# Altium schematic symbol library con-molex.SCHLIB: 368 symbols (part 1 of 6) (continued)
## 53?-05048 (continued)
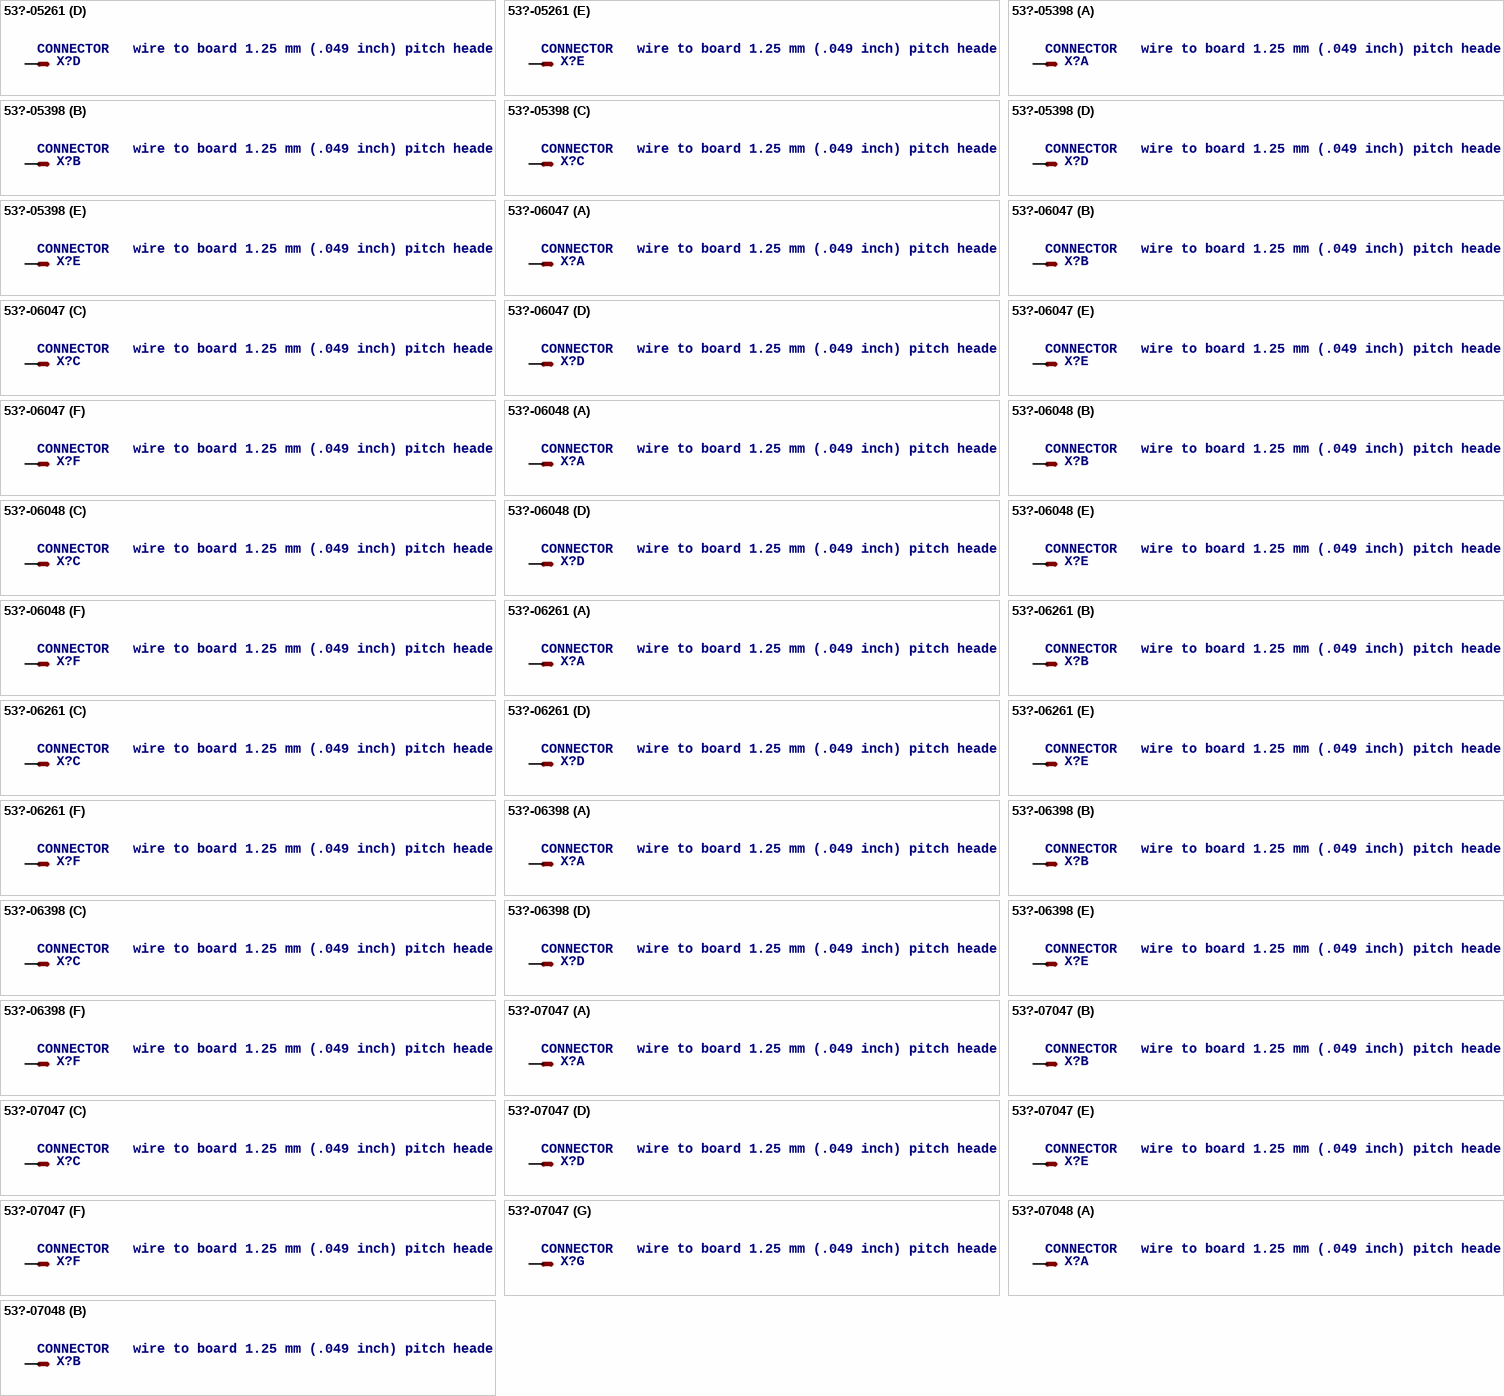
[diagram p7: symbols 53?-05261 to 53?-07048]

## 53?-05261
designator X?, comment CONNECTOR   wire to board 1.25 mm (.049 inch) pitch header
OC_FARNELL: 1433644; OC_NEWARK: unknown
footprint 53261-05
part A pins: 1 S
part B pins: 2 S
part C pins: 3 S
part D pins: 4 S
part E pins: 5 S

## 53?-05398
designator X?, comment CONNECTOR   wire to board 1.25 mm (.049 inch) pitch header
OC_FARNELL: 1125354; OC_NEWARK: unknown
footprint 53398-05
part A pins: 1 S
part B pins: 2 S
part C pins: 3 S
part D pins: 4 S
part E pins: 5 S

## 53?-06047
designator X?, comment CONNECTOR   wire to board 1.25 mm (.049 inch) pitch header
MPN: 53047-0610-C; OC_FARNELL: 9733078; OC_NEWARK: 03M2965
footprint 53047-06
part A pins: 1 S
part B pins: 2 S
part C pins: 3 S
part D pins: 4 S
part E pins: 5 S
part F pins: 6 S

## 53?-06048
designator X?, comment CONNECTOR   wire to board 1.25 mm (.049 inch) pitch header
MPN: 53048-0610; MF: WALDOM/MOLEX; OC_FARNELL: 1012260; OC_NEWARK: 38C9911
footprint 53048-06
part A pins: 1 S
part B pins: 2 S
part C pins: 3 S
part D pins: 4 S
part E pins: 5 S
part F pins: 6 S

## 53?-06261
designator X?, comment CONNECTOR   wire to board 1.25 mm (.049 inch) pitch header
OC_FARNELL: 1125375; OC_NEWARK: unknown
footprint 53261-06
part A pins: 1 S
part B pins: 2 S
part C pins: 3 S
part D pins: 4 S
part E pins: 5 S
part F pins: 6 S

## 53?-06398
designator X?, comment CONNECTOR   wire to board 1.25 mm (.049 inch) pitch header
OC_FARNELL: 1125368; OC_NEWARK: unknown
footprint 53398-06
part A pins: 1 S
part B pins: 2 S
part C pins: 3 S
part D pins: 4 S
part E pins: 5 S
part F pins: 6 S

## 53?-07047
designator X?, comment CONNECTOR   wire to board 1.25 mm (.049 inch) pitch header
MPN: 53047-0710-C; OC_FARNELL: 9732870; OC_NEWARK: 11M0149
footprint 53047-07
part A pins: 1 S
part B pins: 2 S
part C pins: 3 S
part D pins: 4 S
part E pins: 5 S
part F pins: 6 S
part G pins: 7 S

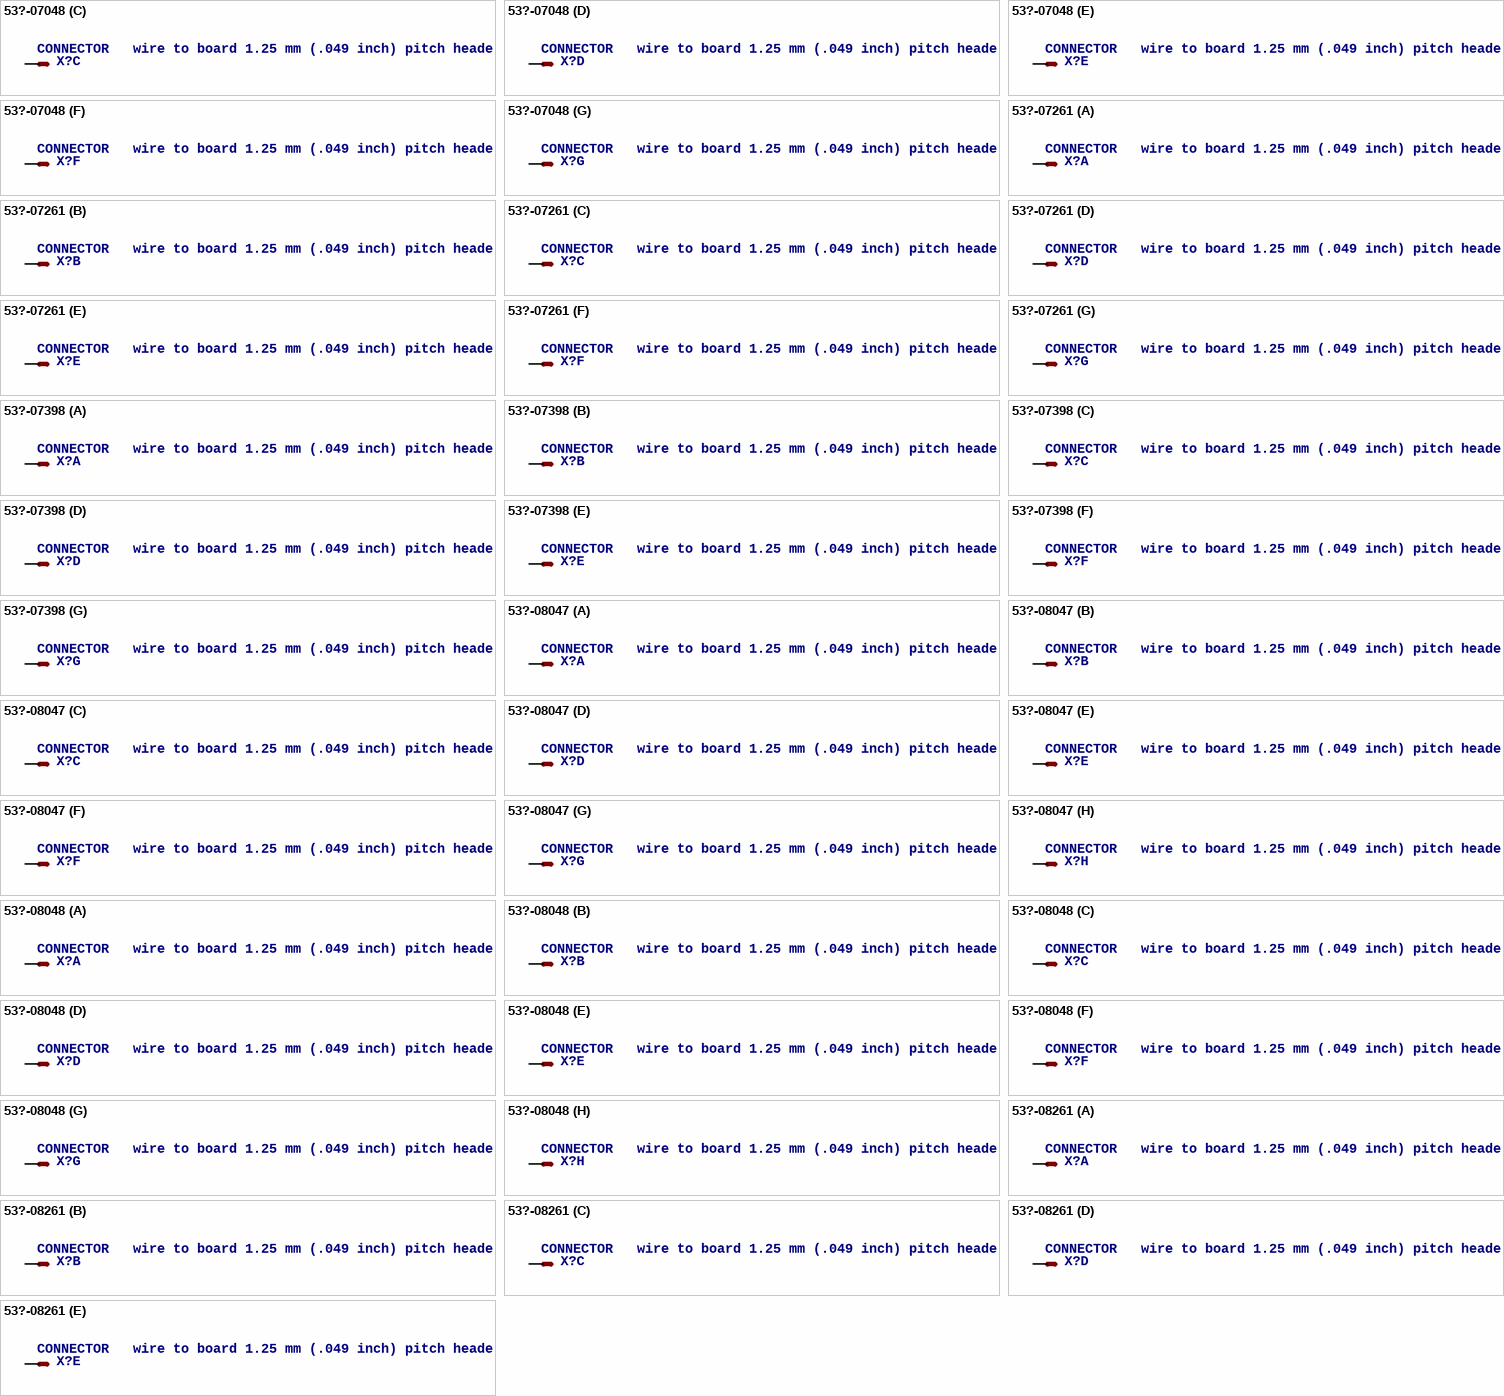
[diagram p8: symbols 53?-07048 to 53?-08261]

## 53?-07048
designator X?, comment CONNECTOR   wire to board 1.25 mm (.049 inch) pitch header
MPN: 53048-0710; OC_FARNELL: 9732934; OC_NEWARK: 98K9835
footprint 53048-07
part A pins: 1 S
part B pins: 2 S
part C pins: 3 S
part D pins: 4 S
part E pins: 5 S
part F pins: 6 S
part G pins: 7 S

## 53?-07261
designator X?, comment CONNECTOR   wire to board 1.25 mm (.049 inch) pitch header
OC_FARNELL: 1125361; OC_NEWARK: unknown
footprint 53261-07
part A pins: 1 S
part B pins: 2 S
part C pins: 3 S
part D pins: 4 S
part E pins: 5 S
part F pins: 6 S
part G pins: 7 S

## 53?-07398
designator X?, comment CONNECTOR   wire to board 1.25 mm (.049 inch) pitch header
OC_FARNELL: 9786368; OC_NEWARK: unknown
footprint 53398-07
part A pins: 1 S
part B pins: 2 S
part C pins: 3 S
part D pins: 4 S
part E pins: 5 S
part F pins: 6 S
part G pins: 7 S

## 53?-08047
designator X?, comment CONNECTOR   wire to board 1.25 mm (.049 inch) pitch header
MPN: 53047-0810; OC_FARNELL: 1012258; OC_NEWARK: 98K9826
footprint 53047-08
part A pins: 1 S
part B pins: 2 S
part C pins: 3 S
part D pins: 4 S
part E pins: 5 S
part F pins: 6 S
part G pins: 7 S
part H pins: 8 S

## 53?-08048
designator X?, comment CONNECTOR   wire to board 1.25 mm (.049 inch) pitch header
MPN: 53048-0810; MF: WALDOM/MOLEX; OC_FARNELL: 9733094; OC_NEWARK: 38C9913
footprint 53048-08
part A pins: 1 S
part B pins: 2 S
part C pins: 3 S
part D pins: 4 S
part E pins: 5 S
part F pins: 6 S
part G pins: 7 S
part H pins: 8 S

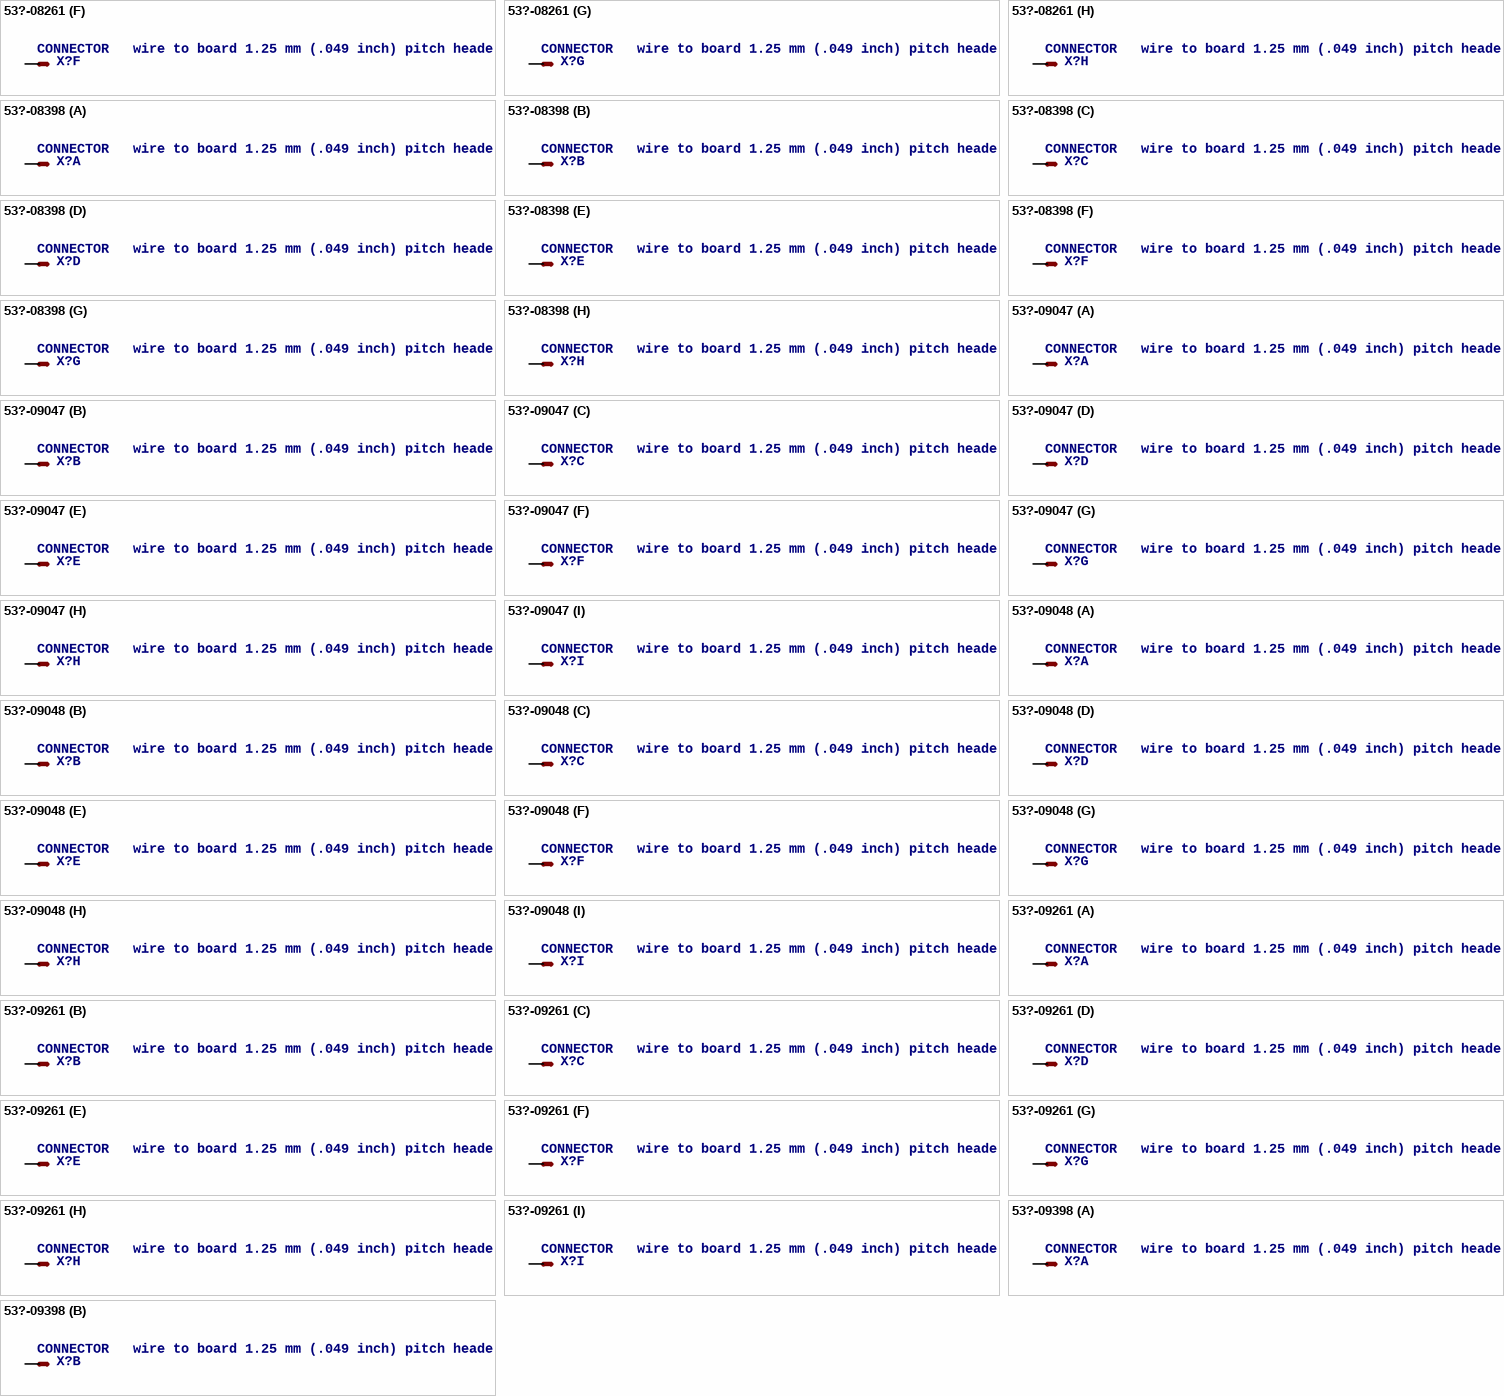
[diagram p9: symbols 53?-08261 to 53?-09398]

## 53?-08261
designator X?, comment CONNECTOR   wire to board 1.25 mm (.049 inch) pitch header
OC_FARNELL: 1125376; OC_NEWARK: unknown
footprint 53261-08
part A pins: 1 S
part B pins: 2 S
part C pins: 3 S
part D pins: 4 S
part E pins: 5 S
part F pins: 6 S
part G pins: 7 S
part H pins: 8 S

## 53?-08398
designator X?, comment CONNECTOR   wire to board 1.25 mm (.049 inch) pitch header
OC_FARNELL: 1125371; OC_NEWARK: unknown
footprint 53398-08
part A pins: 1 S
part B pins: 2 S
part C pins: 3 S
part D pins: 4 S
part E pins: 5 S
part F pins: 6 S
part G pins: 7 S
part H pins: 8 S

## 53?-09047
designator X?, comment CONNECTOR   wire to board 1.25 mm (.049 inch) pitch header
MPN: 53047-0910; OC_FARNELL: 9732888; OC_NEWARK: 98K9827
footprint 53047-09
part A pins: 1 S
part B pins: 2 S
part C pins: 3 S
part D pins: 4 S
part E pins: 5 S
part F pins: 6 S
part G pins: 7 S
part H pins: 8 S
part I pins: 9 S

## 53?-09048
designator X?, comment CONNECTOR   wire to board 1.25 mm (.049 inch) pitch header
MPN: 53048-0910; OC_FARNELL: 1012239; OC_NEWARK: 98K9837
footprint 53048-09
part A pins: 1 S
part B pins: 2 S
part C pins: 3 S
part D pins: 4 S
part E pins: 5 S
part F pins: 6 S
part G pins: 7 S
part H pins: 8 S
part I pins: 9 S

## 53?-09261
designator X?, comment CONNECTOR   wire to board 1.25 mm (.049 inch) pitch header
MPN: 53261-0971; OC_FARNELL: 1125362; OC_NEWARK: 93K4249
footprint 53261-09
part A pins: 1 S
part B pins: 2 S
part C pins: 3 S
part D pins: 4 S
part E pins: 5 S
part F pins: 6 S
part G pins: 7 S
part H pins: 8 S
part I pins: 9 S

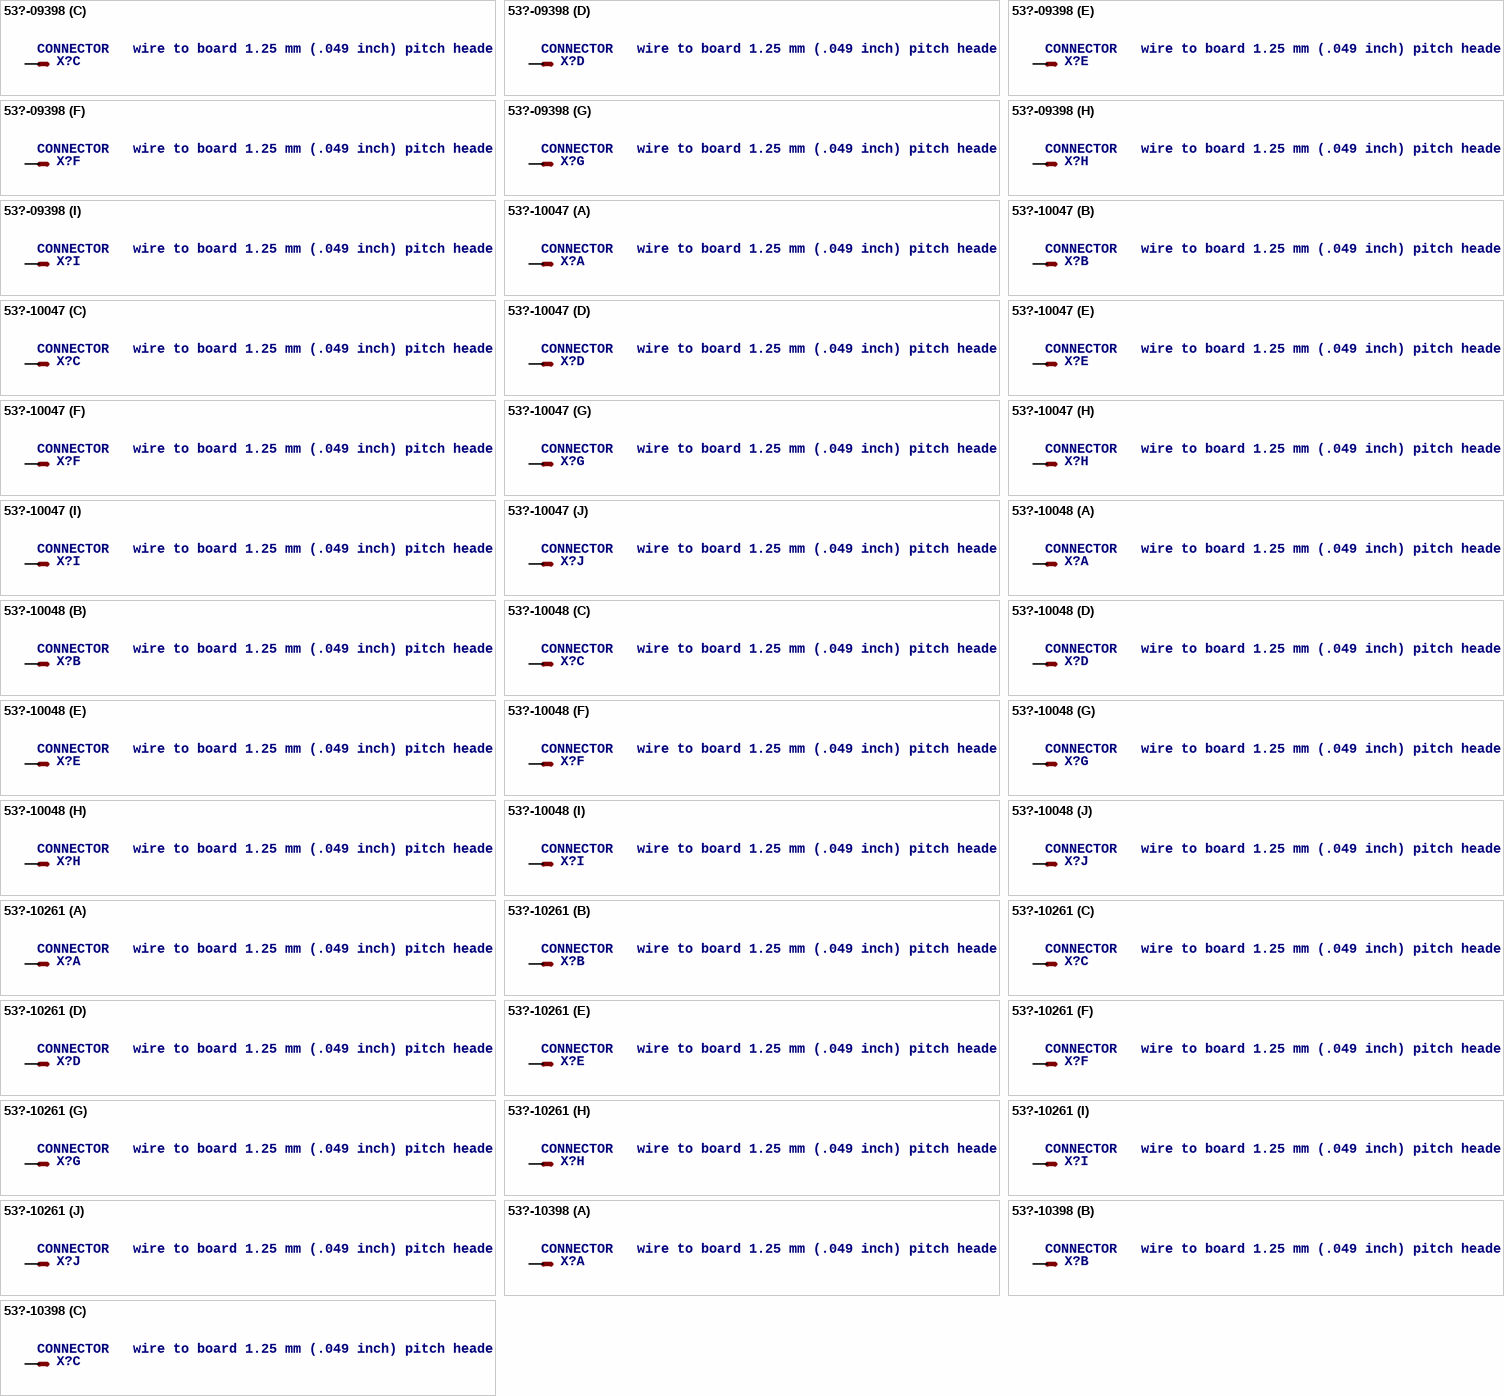
[diagram p10: symbols 53?-09398 to 53?-10398]

## 53?-09398
designator X?, comment CONNECTOR   wire to board 1.25 mm (.049 inch) pitch header
OC_FARNELL: unknown; OC_NEWARK: unknown
footprint 53398-09
part A pins: 1 S
part B pins: 2 S
part C pins: 3 S
part D pins: 4 S
part E pins: 5 S
part F pins: 6 S
part G pins: 7 S
part H pins: 8 S
part I pins: 9 S

## 53?-10047
designator X?, comment CONNECTOR   wire to board 1.25 mm (.049 inch) pitch header
MPN: 53047-1010; MF: MOLEX; OC_FARNELL: 9733086; OC_NEWARK: 57H4711
footprint 53047-10
part A pins: 1 S
part B pins: 2 S
part C pins: 3 S
part D pins: 4 S
part E pins: 5 S
part F pins: 6 S
part G pins: 7 S
part H pins: 8 S
part I pins: 9 S
part J pins: 10 S

## 53?-10048
designator X?, comment CONNECTOR   wire to board 1.25 mm (.049 inch) pitch header
MPN: 53048-1010; OC_FARNELL: 9733108; OC_NEWARK: 98K9838
footprint 53048-10
part A pins: 1 S
part B pins: 2 S
part C pins: 3 S
part D pins: 4 S
part E pins: 5 S
part F pins: 6 S
part G pins: 7 S
part H pins: 8 S
part I pins: 9 S
part J pins: 10 S

## 53?-10261
designator X?, comment CONNECTOR   wire to board 1.25 mm (.049 inch) pitch header
OC_FARNELL: unknown; OC_NEWARK: unknown
footprint 53261-10
part A pins: 1 S
part B pins: 2 S
part C pins: 3 S
part D pins: 4 S
part E pins: 5 S
part F pins: 6 S
part G pins: 7 S
part H pins: 8 S
part I pins: 9 S
part J pins: 10 S

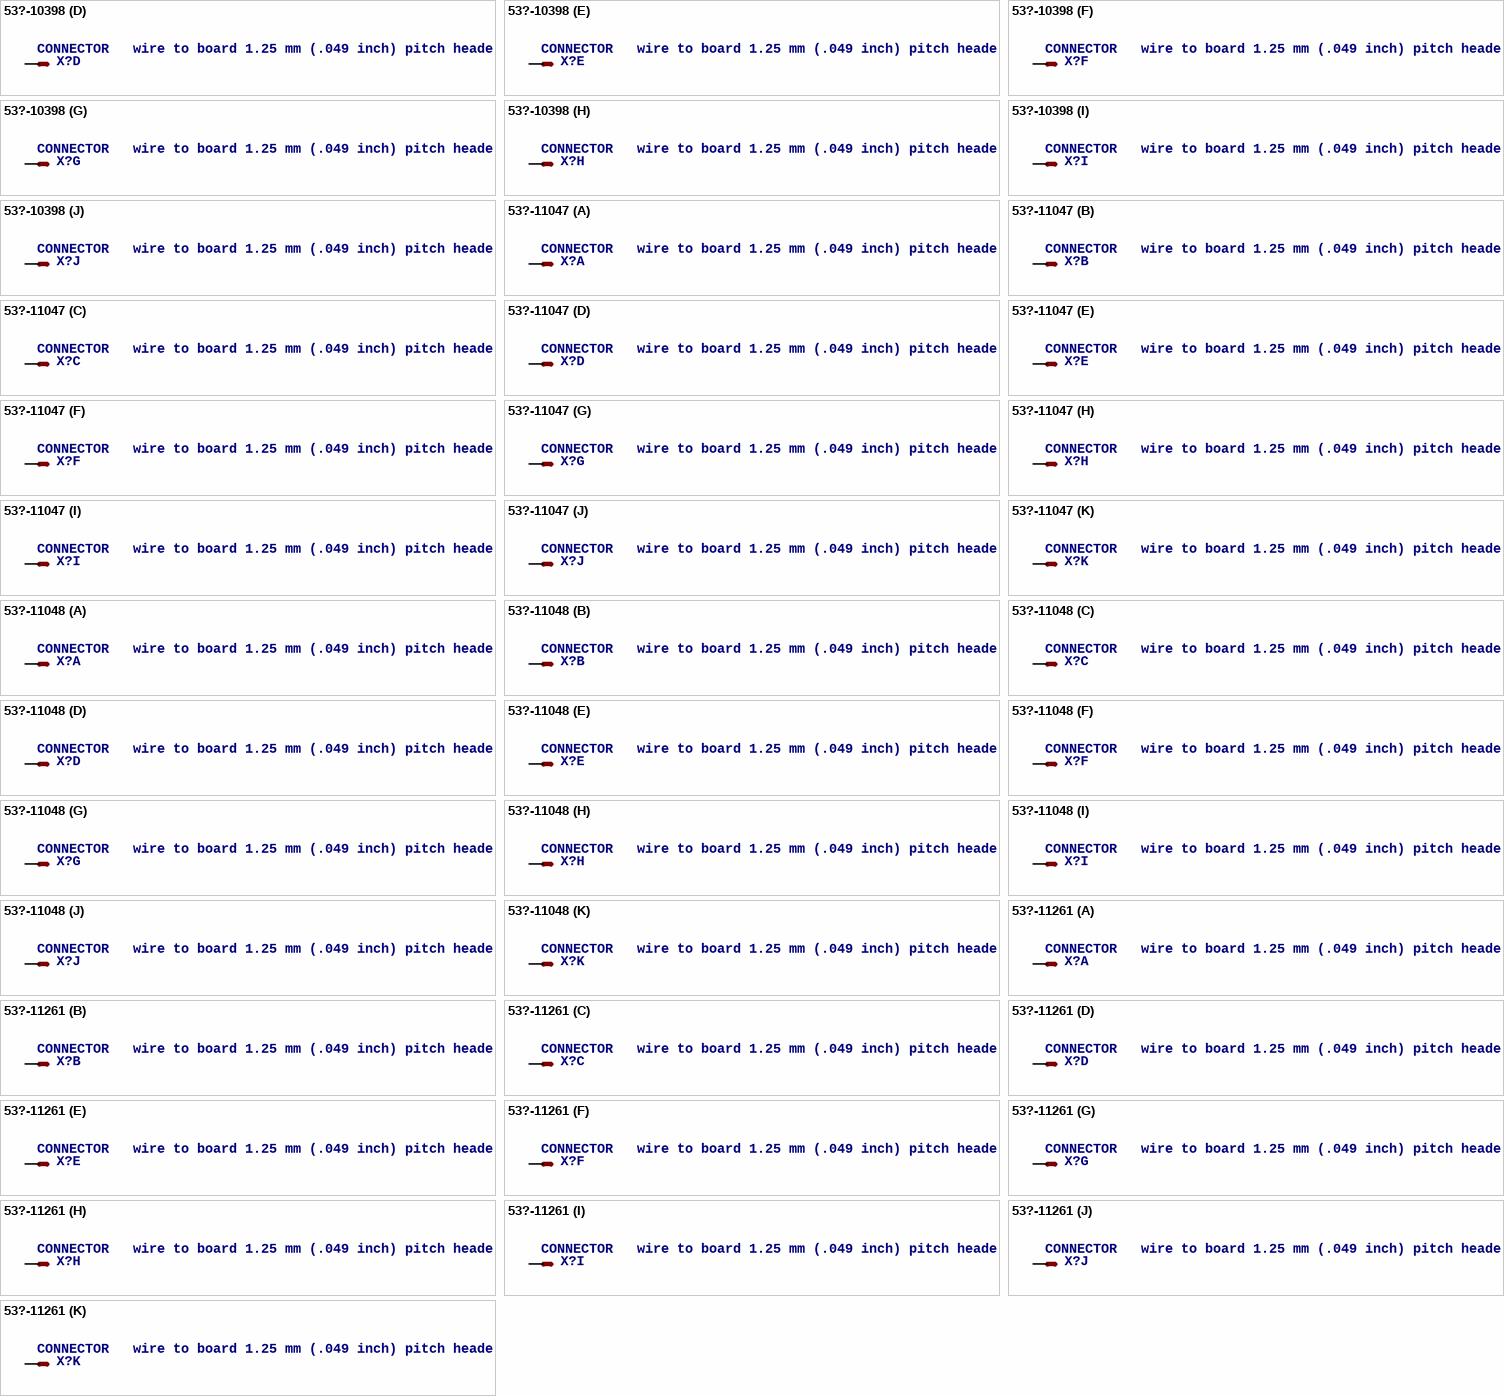
[diagram p11: symbols 53?-10398 to 53?-11261]

## 53?-10398
designator X?, comment CONNECTOR   wire to board 1.25 mm (.049 inch) pitch header
MPN: 53398-1071; MF: MOLEX; OC_FARNELL: unknown; OC_NEWARK: 59J0425
footprint 53398-10
part A pins: 1 S
part B pins: 2 S
part C pins: 3 S
part D pins: 4 S
part E pins: 5 S
part F pins: 6 S
part G pins: 7 S
part H pins: 8 S
part I pins: 9 S
part J pins: 10 S

## 53?-11047
designator X?, comment CONNECTOR   wire to board 1.25 mm (.049 inch) pitch header
MPN: 53047-1110; MF: WALDOM/MOLEX; OC_FARNELL: unknown; OC_NEWARK: 18M8168
footprint 53047-11
part A pins: 1 S
part B pins: 2 S
part C pins: 3 S
part D pins: 4 S
part E pins: 5 S
part F pins: 6 S
part G pins: 7 S
part H pins: 8 S
part I pins: 9 S
part J pins: 10 S
part K pins: 11 S

## 53?-11048
designator X?, comment CONNECTOR   wire to board 1.25 mm (.049 inch) pitch header
MPN: 53048-1110; OC_FARNELL: unknown; OC_NEWARK: 28M9451
footprint 53048-11
part A pins: 1 S
part B pins: 2 S
part C pins: 3 S
part D pins: 4 S
part E pins: 5 S
part F pins: 6 S
part G pins: 7 S
part H pins: 8 S
part I pins: 9 S
part J pins: 10 S
part K pins: 11 S

## 53?-11261
designator X?, comment CONNECTOR   wire to board 1.25 mm (.049 inch) pitch header
MPN: 53261-1171; OC_FARNELL: 1756926; OC_NEWARK: 58K8238
footprint 53261-11
part A pins: 1 S
part B pins: 2 S
part C pins: 3 S
part D pins: 4 S
part E pins: 5 S
part F pins: 6 S
part G pins: 7 S
part H pins: 8 S
part I pins: 9 S
part J pins: 10 S
part K pins: 11 S

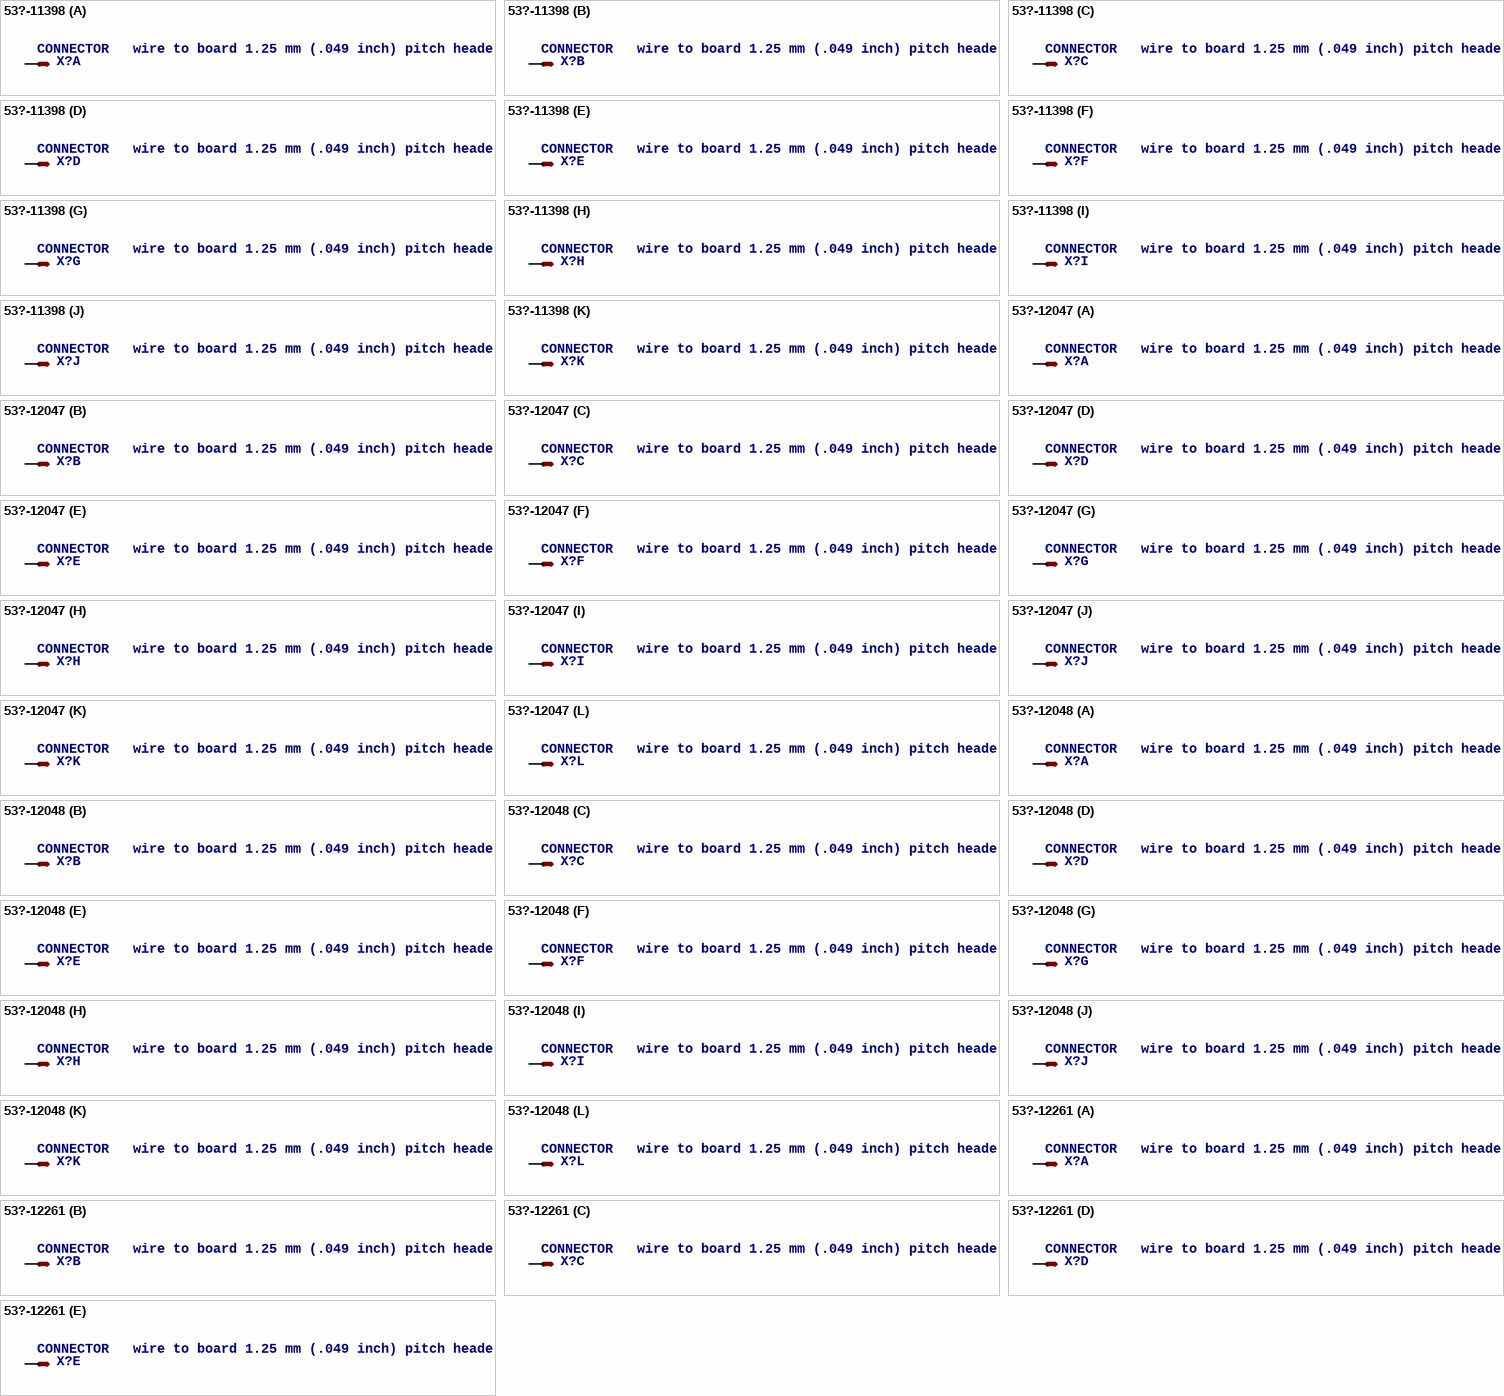
[diagram p12: symbols 53?-11398 to 53?-12261]

## 53?-11398
designator X?, comment CONNECTOR   wire to board 1.25 mm (.049 inch) pitch header
OC_FARNELL: 9786376; OC_NEWARK: unknown
footprint 53398-11
part A pins: 1 S
part B pins: 2 S
part C pins: 3 S
part D pins: 4 S
part E pins: 5 S
part F pins: 6 S
part G pins: 7 S
part H pins: 8 S
part I pins: 9 S
part J pins: 10 S
part K pins: 11 S

## 53?-12047
designator X?, comment CONNECTOR   wire to board 1.25 mm (.049 inch) pitch header
MPN: 53047-1210; MF: WALDOM/MOLEX; OC_FARNELL: 9732896; OC_NEWARK: 18M8169
footprint 53047-12
part A pins: 1 S
part B pins: 2 S
part C pins: 3 S
part D pins: 4 S
part E pins: 5 S
part F pins: 6 S
part G pins: 7 S
part H pins: 8 S
part I pins: 9 S
part J pins: 10 S
part K pins: 11 S
part L pins: 12 S

## 53?-12048
designator X?, comment CONNECTOR   wire to board 1.25 mm (.049 inch) pitch header
MPN: 53048-1210; MF: WALDOM/MOLEX; OC_FARNELL: unknown; OC_NEWARK: 71H4145
footprint 53048-12
part A pins: 1 S
part B pins: 2 S
part C pins: 3 S
part D pins: 4 S
part E pins: 5 S
part F pins: 6 S
part G pins: 7 S
part H pins: 8 S
part I pins: 9 S
part J pins: 10 S
part K pins: 11 S
part L pins: 12 S

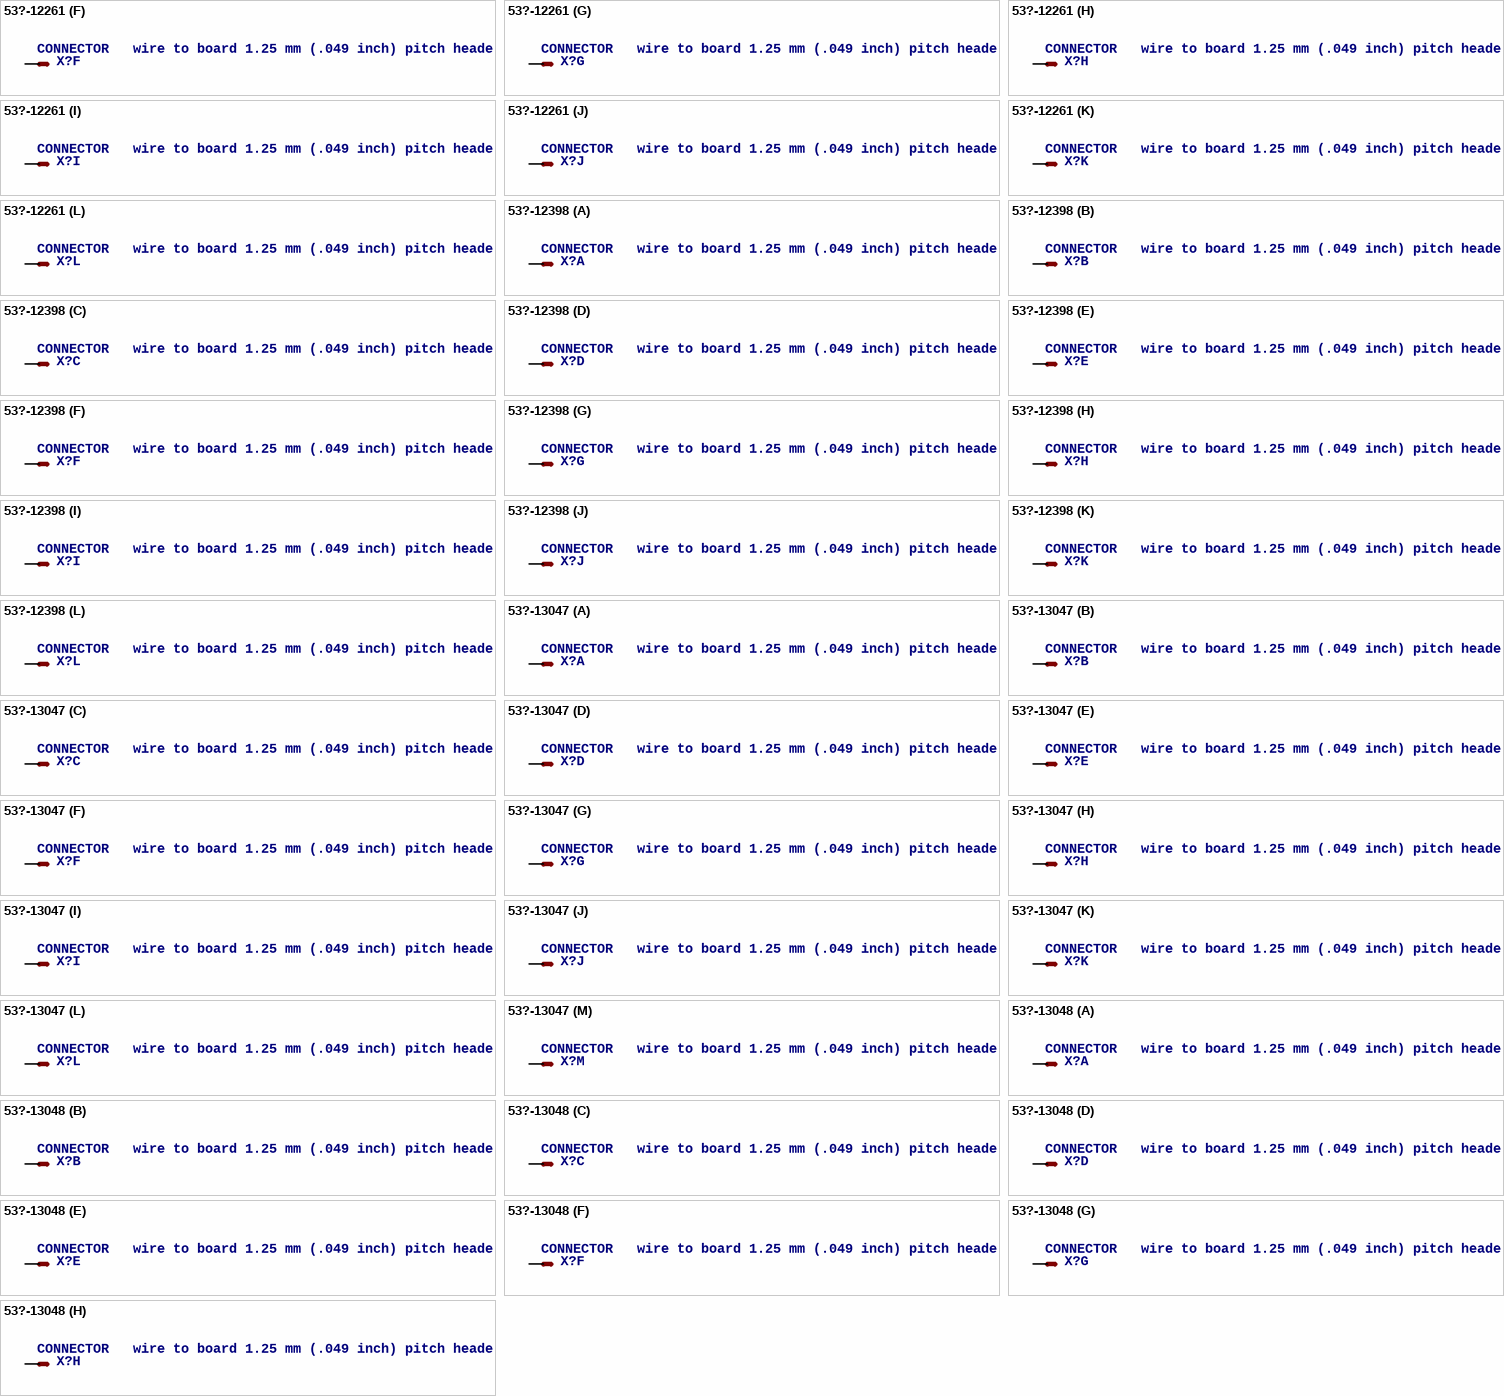
[diagram p13: symbols 53?-12261 to 53?-13048]

## 53?-12261
designator X?, comment CONNECTOR   wire to board 1.25 mm (.049 inch) pitch header
MPN: 53261-1271; MF: MOLEX; OC_FARNELL: 1125363; OC_NEWARK: 59J0244
footprint 53261-12
part A pins: 1 S
part B pins: 2 S
part C pins: 3 S
part D pins: 4 S
part E pins: 5 S
part F pins: 6 S
part G pins: 7 S
part H pins: 8 S
part I pins: 9 S
part J pins: 10 S
part K pins: 11 S
part L pins: 12 S

## 53?-12398
designator X?, comment CONNECTOR   wire to board 1.25 mm (.049 inch) pitch header
OC_FARNELL: 1125356; OC_NEWARK: unknown
footprint 53398-12
part A pins: 1 S
part B pins: 2 S
part C pins: 3 S
part D pins: 4 S
part E pins: 5 S
part F pins: 6 S
part G pins: 7 S
part H pins: 8 S
part I pins: 9 S
part J pins: 10 S
part K pins: 11 S
part L pins: 12 S

## 53?-13047
designator X?, comment CONNECTOR   wire to board 1.25 mm (.049 inch) pitch header
MPN: 53047-1310-C; OC_FARNELL: 1012238; OC_NEWARK: 03N7646
footprint 53047-13
part A pins: 1 S
part B pins: 2 S
part C pins: 3 S
part D pins: 4 S
part E pins: 5 S
part F pins: 6 S
part G pins: 7 S
part H pins: 8 S
part I pins: 9 S
part J pins: 10 S
part K pins: 11 S
part L pins: 12 S
part M pins: 13 S

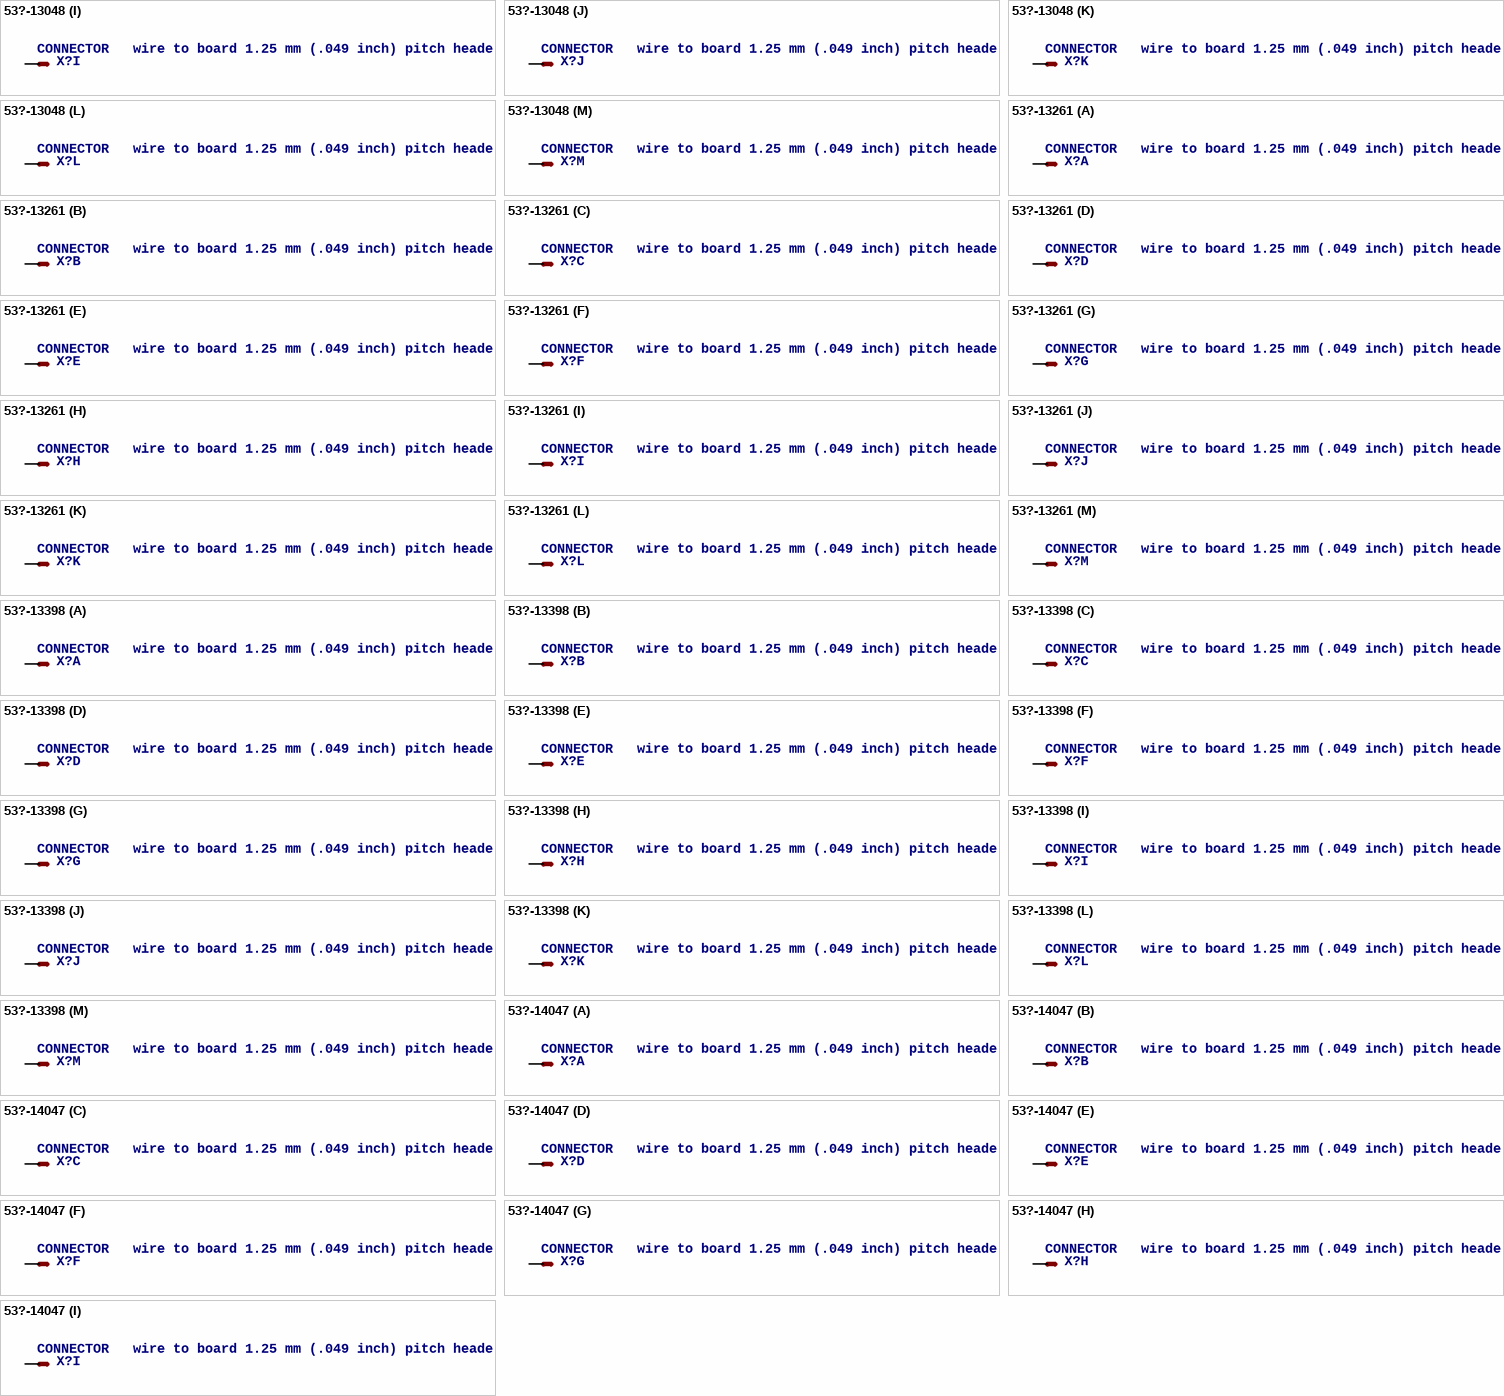
[diagram p14: symbols 53?-13048 to 53?-14047]

## 53?-13048
designator X?, comment CONNECTOR   wire to board 1.25 mm (.049 inch) pitch header
MPN: 53048-1310-C; OC_FARNELL: unknown; OC_NEWARK: 03N7647
footprint 53048-13
part A pins: 1 S
part B pins: 2 S
part C pins: 3 S
part D pins: 4 S
part E pins: 5 S
part F pins: 6 S
part G pins: 7 S
part H pins: 8 S
part I pins: 9 S
part J pins: 10 S
part K pins: 11 S
part L pins: 12 S
part M pins: 13 S

## 53?-13261
designator X?, comment CONNECTOR   wire to board 1.25 mm (.049 inch) pitch header
MPN: 53261-1371; OC_FARNELL: 1756927; OC_NEWARK: 92M6827
footprint 53261-13
part A pins: 1 S
part B pins: 2 S
part C pins: 3 S
part D pins: 4 S
part E pins: 5 S
part F pins: 6 S
part G pins: 7 S
part H pins: 8 S
part I pins: 9 S
part J pins: 10 S
part K pins: 11 S
part L pins: 12 S
part M pins: 13 S
